# Altium footprint library LDCN Components.PcbLib: 426 footprints (part 7 of 27)
Each footprint in its own frame and in the unit in brackets; x right, y up, seen from the top. Pads: shape width x height; smd on the part's side, far side on the other; paste and mask are expansions set on the pad; w line width, h text height; cw(c..) or ccw(c..) is an arc to the next point about the centre after c.
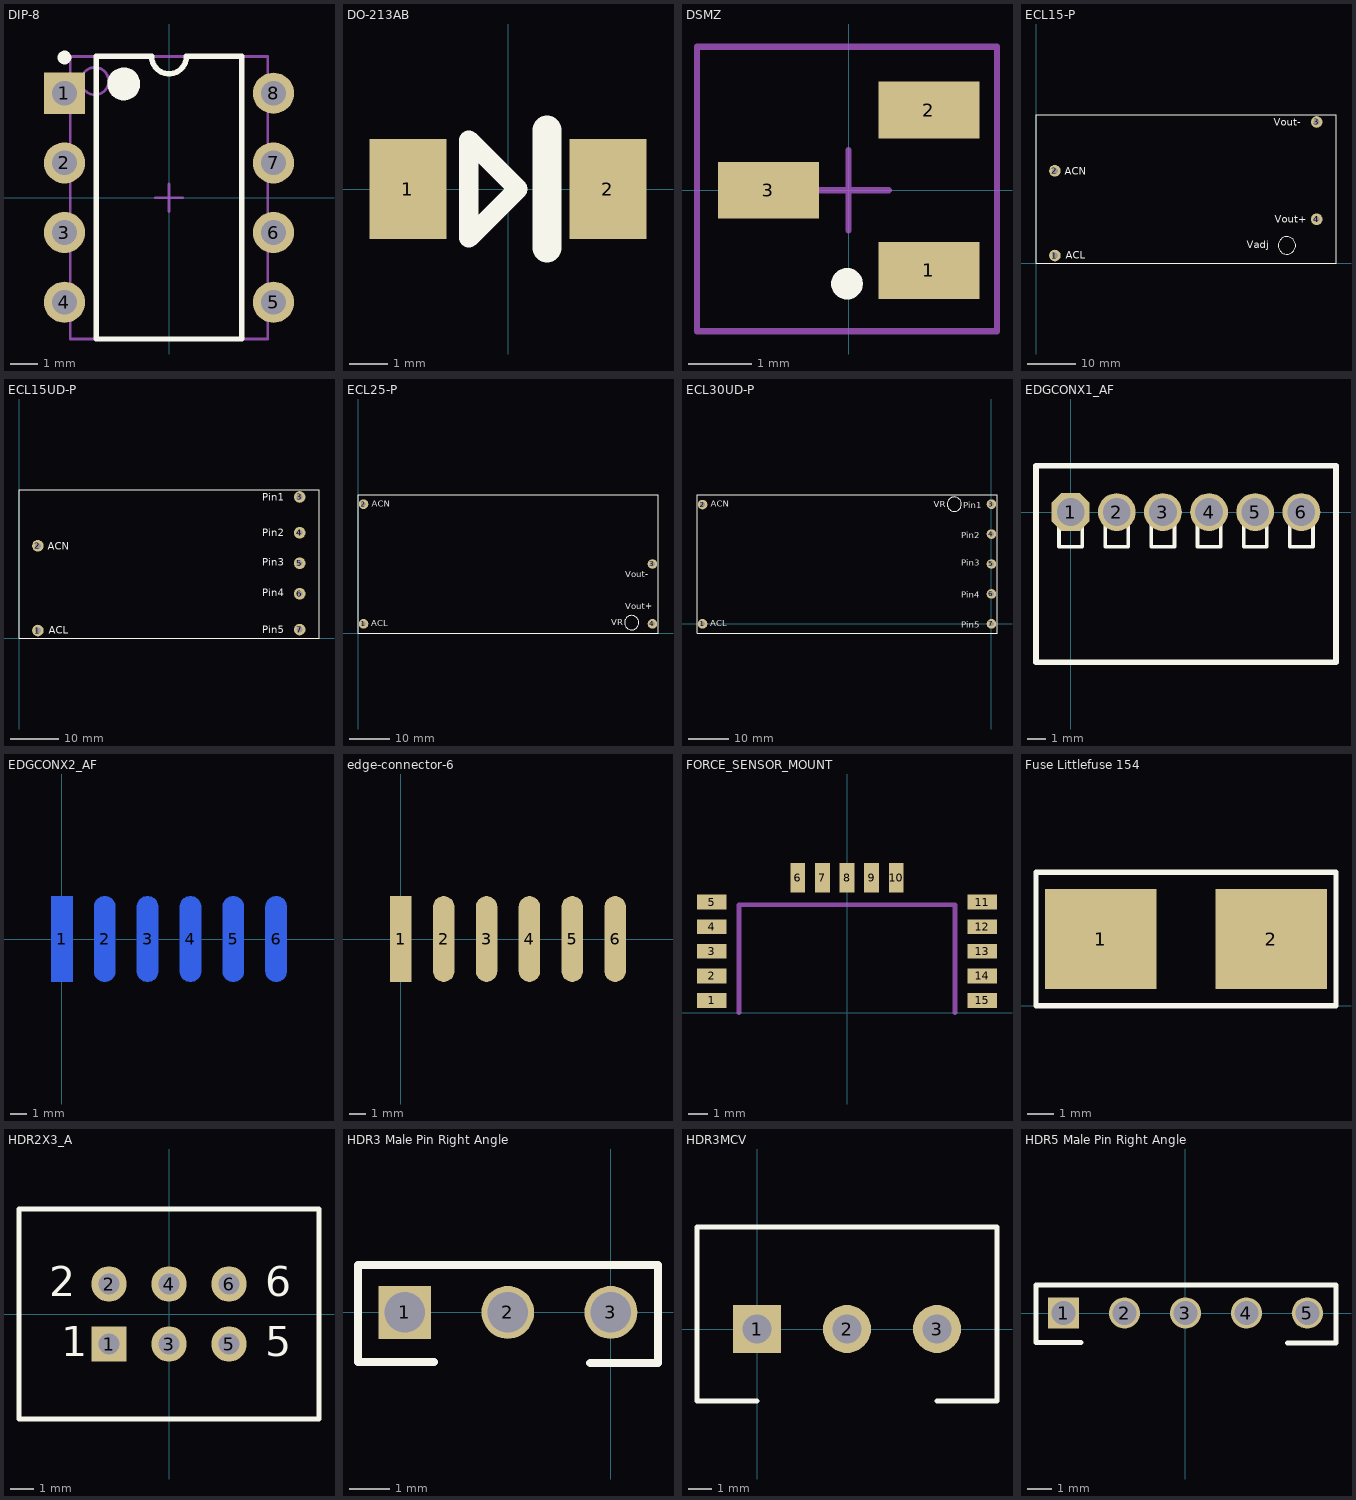
[diagram p6: the footprints below, top view; thin cyan lines are the x and y axes]

## DIP-8 [mm] "DIP; 8 Leads; Row Spacing 7.62 mm; Pitch 2.54 mm"
height 5.08
pads (8):
  rect 1.5x1.5 hole 0.9: 1(-3.81,3.81)
  round 1.5 hole 0.9: 2(-3.81,1.27) 3(-3.81,-1.27) 4(-3.81,-3.81) 5(3.81,-3.81) 6(3.81,-1.27) 7(3.81,1.27) 8(3.81,3.81)
Top Overlay:
  circle w0.25: c-3.81,5.11 r0.125
  circle w0.6: c-1.65,4.15 r0.3
  lines w0.2: -2.65,-5.15 -2.65,5.15 -0.635,5.15 ccw(c0,5.15) 0.635,5.15 2.65,5.15 2.65,-5.15 -2.65,-5.15
Mechanical 13:
  circle w0.1: c-2.7,4.25 r0.5
  lines w0.1: -3.6,-5.15 -3.6,5.15 3.6,5.15 3.6,-5.15 -3.6,-5.15
Mechanical 15:
  lines w0.1: -0.5,0 0.5,0 ; 0,-0.5 0,0.5
3D body: height 5.08, standoff 0, extent -3.6,-5.15 3.6,5.15

## DO-213AB [mm]
height 3
pads (2):
  rect 2x2.6 smd: 1(-2.6,0) 2(2.6,0)
Top Overlay:
  lines w0.508: -1.016,-1.27 -1.016,1.27 0.254,0 -1.016,-1.27
  lines w0.762: 1.016,-1.524 1.016,1.524

## DSMZ [mm] "Divider"
height 1.8
pads (3):
  rect 1.6x0.9 smd: 1(1.27,-1.27) 2(1.27,1.27) 3(-1.27,0)
Top Overlay:
  circle w0.25: c-0.025,-1.48 r0.125
Mechanical 15:
  lines w0.1: -0.635,0 0.635,0 ; 0,-0.635 0,0.635 ; -2.4,-2.23 2.35,-2.23 2.35,2.27 -2.4,2.27 -2.4,-2.23
3D body: height 1.8, standoff 0, extent -1.27,-1.98 1.27,2.02

## ECL15-P [mm] "XP Power ECL15 PCB Mount Power Supply"
height 24
pads (4):
  round 2.4 hole 1.2: 1(3.9,1.6) 2(3.9,19.1) 3(58,29.2) 4(58,9.1)
Top Overlay:
  circle w0.254: c51.849,3.683 r1.796
  lines w0.254: 0,0 0,30.7 62,30.7 62,0 0,0
  text "Vout-" at 49.174,28.397 h1.52
  text "Vout+" at 49.301,8.331 h1.52
  text "ACN" at 5.944,18.288 h1.52
  text "ACL" at 6.172,0.914 h1.52
  text "Vadj" at 43.561,3.124 h1.52

## ECL15UD-P [mm] "XP Power ECL15 PCB Mount Power Supply - Dual Output"
height 24
pads (7):
  round 2.4 hole 1.2: 1(3.9,1.6) 2(3.9,19.1) 3(58,29.2) 4(58,21.8) 5(58,15.5) 6(58,9.2) 7(58,1.8)
Top Overlay:
  lines w0.254: 0,0 0,30.7 62,30.7 62,0 0,0
  text "Pin1" at 50.292,28.448 h1.52
  text "ACN" at 5.944,18.288 h1.52
  text "ACL" at 6.172,0.914 h1.52
  text "Pin2" at 50.292,21.082 h1.52
  text "Pin3" at 50.292,14.986 h1.52
  text "Pin4" at 50.292,8.636 h1.52
  text "Pin5" at 50.292,1.016 h1.52

## ECL25-P [mm] "XP Power ECL25 PCB Mount Power Supply"
height 27
pads (4):
  round 2.4 hole 1.2: 1(1.4,2.3) 2(1.4,32.3) 3(73.8,17.3) 4(73.8,2.3)
Top Overlay:
  circle w0.254: c68.604,2.6 r1.796
  lines w0.254: 0,0 0,34.6 75.2,34.6 75.2,0 0,0
  text "Vout-" at 67,14 h1.52
  text "Vout+" at 67,6 h1.52
  text "ACN" at 3.4,31.7 h1.52
  text "ACL" at 3.3,1.7 h1.52
  text "VR" at 63.5,2 h1.52

## ECL30UD-P [mm] "XP Power ECL30UD PCB Mount Power Supply"
height 27
pads (7):
  round 2.4 hole 1.2: 1(-72.4,0) 2(-72.4,29.9) 3(0,30) 4(0,22.5) 5(0,15) 6(0,7.5) 7(0,0)
Top Overlay:
  circle w0.254: c-9.296,30 r1.796
  lines w0.254: -73.8,-2.3 -73.8,32.3 1.4,32.3 1.4,-2.3 -73.8,-2.3
  text "Pin1" at -7,29 h1.52
  text "ACN" at -70.4,29.4 h1.52
  text "ACL" at -70.5,-0.6 h1.52
  text "VR" at -14.5,29.25 h1.52
  text "Pin2" at -7.5,21.5 h1.52
  text "Pin3" at -7.5,14.5 h1.52
  text "Pin4" at -7.5,6.5 h1.52
  text "Pin5" at -7.5,-1 h1.52

## EDGCONX1_AF [mil]
pads (6):
  oct 82x82 hole 60: 1(0,0)
  round 82 hole 60: 2(100,0) 3(200,0) 4(300,0) 5(400,0) 6(500,0)
Top Overlay:
  lines w8: -25,-25 -25,-75 25,-75 25,-25 ; 75,-25 75,-75 125,-75 125,-25 ; 175,-25 175,-75 225,-75 225,-25 ; 275,-25 275,-75 325,-75 325,-25 ; 375,-25 375,-75 425,-75 425,-25 ; 475,-25 475,-75 525,-75 525,-25
  lines w12: -75,-325 575,-325 575,100 -75,100 -75,-325

## EDGCONX2_AF [mm]
pads (6):
  rect 1.27x5.08 smd far side: 1(0,0)
  oval 1.27x5.08 smd far side: 2(2.54,0) 3(5.08,0) 4(7.62,0) 5(10.16,0) 6(12.7,0)

## edge-connector-6 [mm]
pads (6):
  rect 1.27x5.08 smd: 1(0,0)
  oval 1.27x5.08 smd: 2(2.54,0) 3(5.08,0) 4(7.62,0) 5(10.16,0) 6(12.7,0)

## FORCE_SENSOR_MOUNT [mil]
pads (15):
  rect 60x30 smd: 1(-275,25) 2(-275,75) 3(-275,125) 4(-275,175) 5(-275,225) 11(275,225) 12(275,175) 13(275,125) 14(275,75) 15(275,25)
  rect 30x60 smd: 6(-100,275) 7(-50,275) 8(0,275) 9(50,275) 10(100,275)
Mechanical 1:
  lines w10: -219.69,0 -219.69,219.69 219.69,219.69 219.69,0

## Fuse Littlefuse 154 [mm]
pads (2):
  rect 4.24x3.81 smd: 1(-10.235,2.54) 2(-3.735,2.54)
Top Overlay:
  lines w0.2: -12.7,0 -12.7,5.08 -1.27,5.08 -1.27,0 -12.7,0

## HDR2X3_A [mm] "Connector; Header; 3x2 Position"
pads (6):
  rect 1.5x1.5 hole 0.9: 1(-2.54,-1.27)
  round 1.5 hole 0.9: 2(-2.54,1.27) 3(0,-1.27) 4(0,1.27) 5(2.54,-1.27) 6(2.54,1.27)
Top Overlay:
  lines w0.2: -6.35,-4.445 6.35,-4.445 6.35,4.445 -6.35,4.445 ; -6.35,-4.4 -6.35,4.4
  text "1" at -4.572,-1.778 h1.27
  text "2" at -5.08,0.762 h1.27
  text "5" at 4.064,-1.778 h1.27
  text "6" at 4.064,0.762 h1.27

## HDR3 Male Pin Right Angle [mm] "HDR3 Male Pin Right Angle"
height 2.5
pads (3):
  rect 1.3x1.3 hole 1: 1(-5.08,0)
  round 1.3 hole 1: 2(-2.54,0) 3(0,0)
Top Overlay:
  lines w0.2: -4.36,-1.22 -6.23,-1.22 -6.23,1.17 1.16,1.17 1.16,-1.25 -0.51,-1.25
3D body "User Library-Header_Male_RA_Low_3Pin.STEP": height 2.51, standoff -3, extent -6.35,-9.81 1.27,0.32

## HDR3MCV [mil] "Connector; Header MCV; 3 Position"
pads (3):
  rect 80x80 hole 48: 1(0,0)
  round 80 hole 48: 2(150,0) 3(300,0)
Top Overlay:
  lines w7.87: 0,-120 -100,-120 -100,170 400,170 400,-120 300,-120

## HDR5 Male Pin Right Angle [mm] "HDR5 Male Pin Right Angle"
height 2.5
pads (5):
  rect 1.3x1.3 hole 1: 1(-5.08,0)
  round 1.3 hole 1: 2(-2.54,0) 3(0,0) 4(2.54,0) 5(5.08,0)
Top Overlay:
  lines w0.2: -4.36,-1.22 -6.23,-1.22 -6.23,1.17 3.725,1.17 6.25,1.176 ; 4.25,-1.25 6.275,-1.25 6.275,1.175
3D body "User Library-Header_Male_RA_Low_5Pin.STEP": height 2.51, standoff -3, extent -6.47,-9.76 6.23,0.37